# Altium footprint library Amirreza.PcbLib: 524 footprints (part 24 of 33)
Each footprint in its own frame and in the unit in brackets; x right, y up, seen from the top. Pads: shape width x height; smd on the part's side, far side on the other; paste and mask are expansions set on the pad; w line width, h text height; cw(c..) or ccw(c..) is an arc to the next point about the centre after c.
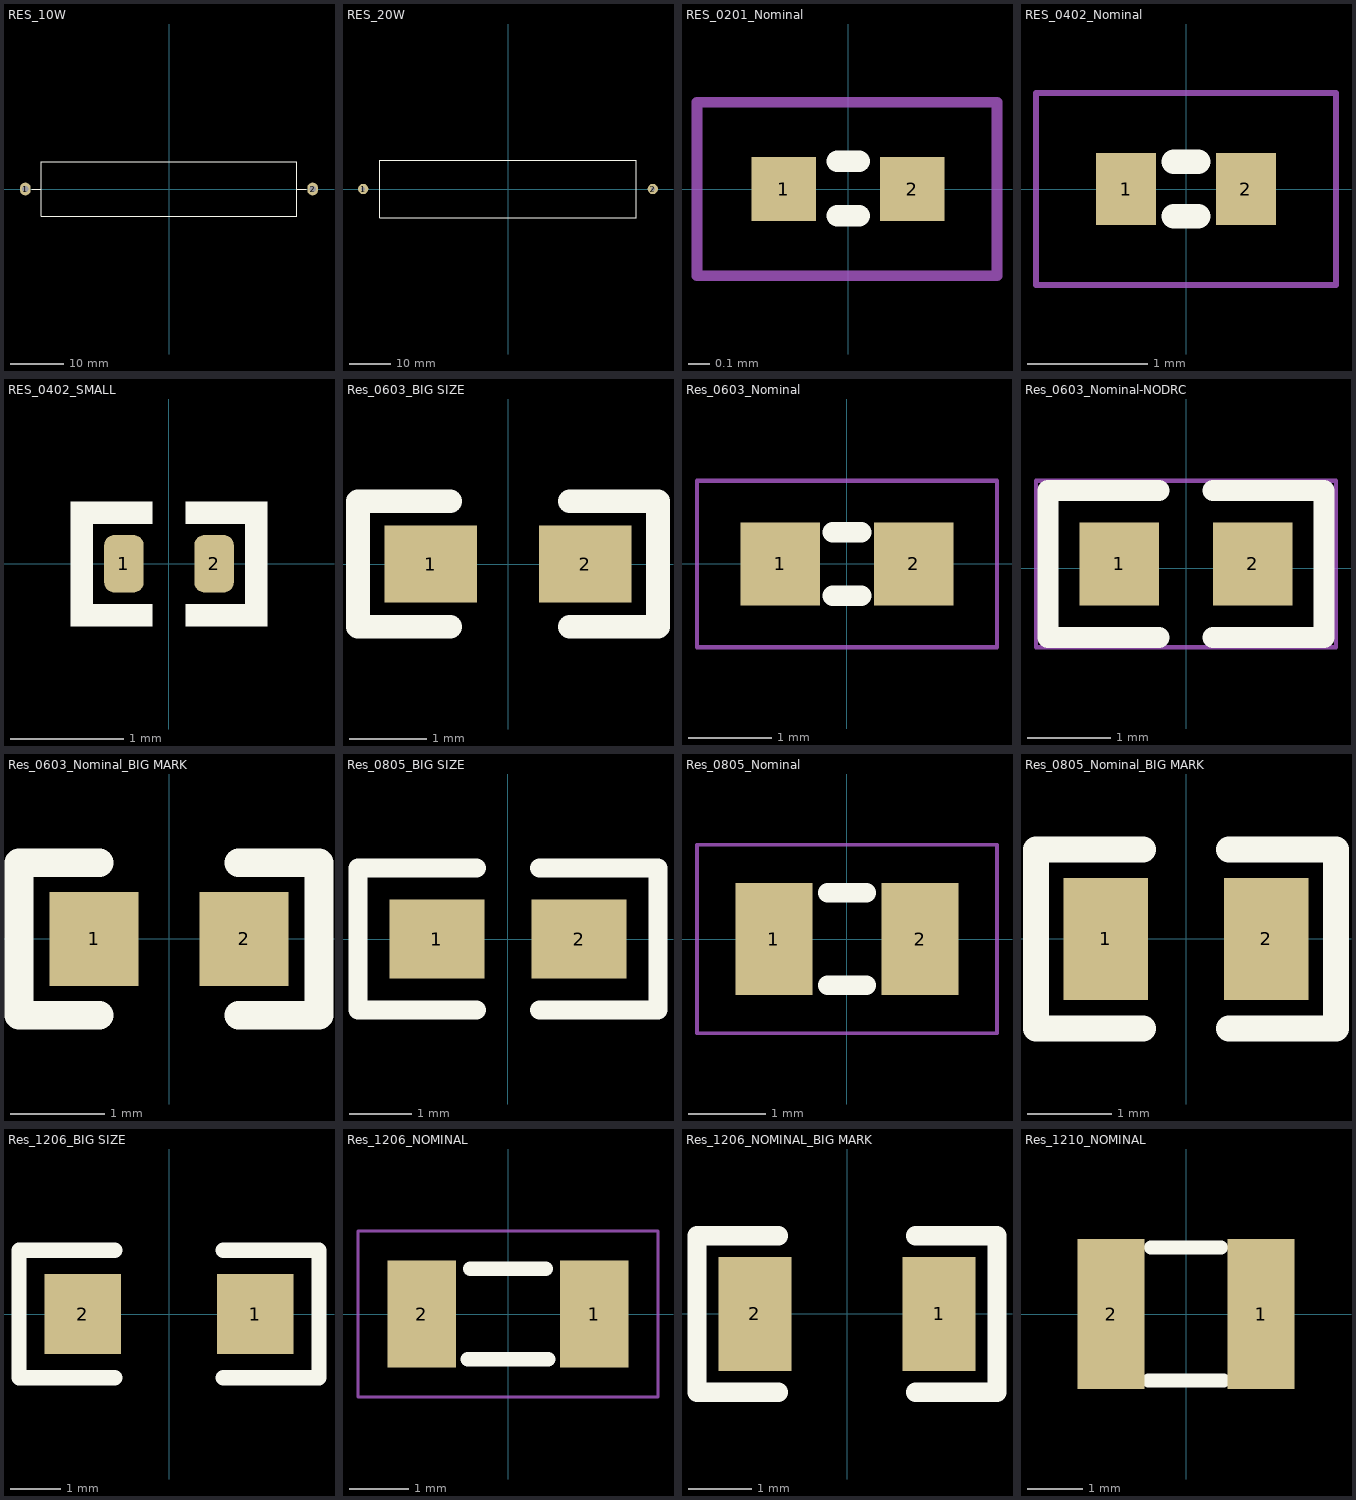
[diagram p23: the footprints below, top view; thin cyan lines are the x and y axes]

## RES_10W [mm] "RESISTOR 10 WATT, Ceramic Wirewound"
height 9
pads (2):
  oval 2x2.4 hole 1.2: 1(-27,0) 2(27,0)
Top Overlay:
  lines w0.2: -25.8,0 -24,0 ; 24,0 25.8,0 ; -24,-5.1 24,-5.1 24,5.1 -24,5.1 -24,-5.1
3D body: height 9, standoff 0, extent -23.9,-5 23.9,5
3D body: height 4.9, standoff 4.1, extent -27.4,-0.4 -23.9,0.4
3D body: height 4.8, standoff -2, extent -27.399,-0.397 -26.601,0.4
3D body: height 4.8, standoff -2, extent 26.601,-0.4 27.399,0.396
3D body: height 4.9, standoff 4.1, extent 23.9,-0.4 27.4,0.4

## RES_20W [mm]
height 25
pads (2):
  round 2.5 hole 1: 1(-35,0) 2(35,0)
Top Overlay:
  lines w0.1: -31,-7 31,-7 31,7 -31,7 -31,-7

## RES_0201_Nominal [mm] "CHIP Resistor, 0.5x0.25mm, 0201, soldered"
pads (2):
  rect 0.3x0.3 smd mask+0.05: 1(-0.3,0) 2(0.3,0)
Top Overlay:
  lines w0.102: -0.051,-0.124 0.051,-0.124 ; -0.051,0.13 0.051,0.13
Mechanical 13:
  lines w0.05: -0.704,-0.404 0.694,-0.404 0.694,0.404 -0.704,0.404 -0.704,-0.404
3D body "r0201_Res.step": height 0.31, standoff 0, extent -0.44,-0.15 0.44,0.15

## RES_0402_Nominal [mm]
pads (2):
  rect 0.5x0.6 smd: 1(-0.5,0) 2(0.5,0)
Top Overlay:
  lines w0.203: -0.102,-0.229 0.102,-0.229 ; -0.102,0.229 0.102,0.229
Mechanical 13:
  lines w0.05: -1.25,-0.8 -1.25,0.8 1.25,0.8 1.25,-0.8 -1.25,-0.8
3D body "User Library-R SMD 0402.STEP": height 0.35, standoff 0, extent -0.532,-0.25 0.468,0.25

## RES_0402_SMALL [mm]
pads (2):
  rrect50% 0.35x0.508 smd mask+0.075: 1(-0.4,0) 2(0.4,0)
Top Overlay:
  region: -0.675,-0.558 -0.675,0.554 -0.875,0.554 -0.875,-0.558
  rectangle: -0.875,0.354 -0.145,0.554
  rectangle: -0.875,-0.558 -0.145,-0.358
  region: 0.875,-0.558 0.875,0.554 0.675,0.554 0.675,-0.558
  region: 0.875,0.554 0.145,0.554 0.145,0.354 0.875,0.354
  region: 0.875,-0.358 0.145,-0.358 0.145,-0.558 0.875,-0.558
3D body "User Library-R SMD 0402.STEP": height 0.35, standoff 0, extent -0.505,-0.25 0.495,0.25

## Res_0603_BIG SIZE [mm]
pads (2):
  rect 1.2x1 smd: 1(-1,0) 2(1,0)
Top Overlay:
  lines w0.305: -1.94,-0.813 -1.94,0.813 ; -1.889,-0.813 -0.746,-0.813 ; -1.889,0.813 -0.746,0.813 ; 0.797,-0.813 1.94,-0.813 1.94,0.813 0.797,0.813
3D body "User Library-R SMD 0603.STEP": height 0.26, standoff -0.19, extent -0.799,-0.372 0.841,0.478

## Res_0603_Nominal [mm]
pads (2):
  rect 0.95x1 smd: 1(-0.8,0) 2(0.8,0)
Top Overlay:
  lines w0.25: -0.171,-0.381 0.171,-0.381 ; -0.171,0.381 0.171,0.381
Mechanical 13:
  lines w0.05: -1.8,-1 -1.8,1 1.8,1 1.8,-1 -1.8,-1
3D body "User Library-R SMD 0603.STEP": height 0.26, standoff -0.19, extent -0.799,-0.423 0.841,0.427

## Res_0603_Nominal-NODRC [mm]
pads (2):
  rect 0.95x1 smd: 1(-0.8,0.051) 2(0.8,0.051)
Top Overlay:
  lines w0.254: -1.656,-0.83 -1.656,0.932 ; -1.647,-0.83 -0.325,-0.83 ; -1.647,0.932 -0.326,0.932 ; 0.325,-0.83 1.647,-0.83 ; 0.325,0.932 1.647,0.932 ; 1.656,-0.83 1.656,0.932
Mechanical 13:
  lines w0.05: -1.8,-0.949 1.8,-0.949 1.8,1.051 -1.8,1.051 -1.8,-0.949
3D body "User Library-R SMD 0603.STEP": height 0.26, standoff -0.19, extent -0.799,-0.372 0.841,0.478

## Res_0603_Nominal_BIG MARK [mm]
pads (2):
  rect 0.95x1 smd: 1(-0.8,0) 2(0.8,0)
Top Overlay:
  lines w0.305: -0.746,-0.813 -1.6,-0.813 -1.6,0.812 -0.746,0.812 ; 0.746,-0.813 1.6,-0.813 1.6,0.812 0.746,0.812
3D body "User Library-R SMD 0603.STEP": height 0.26, standoff -0.19, extent -0.799,-0.423 0.841,0.427

## Res_0805_BIG SIZE [mil]
pads (2):
  rect 60x50 smd: 1(-45,0) 2(45,0)
Top Overlay:
  lines w12: -20,-45 -95,-45 -95,45 -20,45 ; 20,-45 95,-45 95,45 20,45
3D body "User Library-R SMD 0805.STEP": height 18.34, standoff 0.62, extent -39.55,-24.42 39.19,24.79

## Res_0805_Nominal [mm]
pads (2):
  rect 1x1.45 smd: 1(-0.95,0) 2(0.95,0)
Top Overlay:
  lines w0.25: -0.254,-0.6 0.254,-0.6 ; -0.254,0.6 0.254,0.6
Mechanical 13:
  lines w0.05: -1.95,-1.225 -1.95,1.225 1.95,1.225 1.95,-1.225 -1.95,-1.225
3D body "User Library-R SMD 0805.STEP": height 0.47, standoff 0.02, extent -0.999,-0.625 1.001,0.625

## Res_0805_Nominal_BIG MARK [mm]
pads (2):
  rect 1x1.45 smd: 1(-0.95,0) 2(0.95,0)
Top Overlay:
  lines w0.305: -0.507,-1.06 -1.778,-1.06 -1.778,1.06 -0.507,1.06 ; 0.507,-1.06 1.778,-1.06 1.778,1.06 0.507,1.06
3D body "User Library-R SMD 0805.STEP": height 0.47, standoff 0.02, extent -0.999,-0.625 1.001,0.625

## Res_1206_BIG SIZE [mil]
pads (2):
  rect 60x62.99 smd: 1(67.5,0) 2(-67.5,0)
Top Overlay:
  lines w12: -42.5,-50 -117.5,-50 -117.5,50 -42.5,50 ; 42.5,-50 117.5,-50 117.5,50 42.5,50
3D body "User Library-1206.SLDPRT": height 20.67, standoff -0.98, extent -62.35,-31.62 63.63,31.37

## Res_1206_NOMINAL [mm]
pads (2):
  rect 1.15x1.8 smd: 1(1.45,0) 2(-1.45,0)
Top Overlay:
  lines w0.25: -0.673,-0.762 0.673,-0.762 ; -0.635,0.762 0.635,0.762
Mechanical 13:
  lines w0.05: -2.525,-1.4 -2.525,1.4 2.525,1.4 2.525,-1.4 -2.525,-1.4
3D body "User Library-1206.SLDPRT": height 0.53, standoff -0.03, extent -1.6,-0.787 1.6,0.813

## Res_1206_NOMINAL_BIG MARK [mm]
pads (2):
  rect 1.15x1.8 smd: 1(1.45,0) 2(-1.45,0)
Top Overlay:
  lines w0.305: -1.079,-1.231 -2.363,-1.231 -2.363,1.229 -1.079,1.229 ; 1.078,-1.231 2.362,-1.231 2.362,1.229 1.078,1.229
3D body "User Library-1206.SLDPRT": height 0.53, standoff -0.03, extent -1.6,-0.787 1.6,0.813

## Res_1210_NOMINAL [mm]
pads (2):
  rect 1.2x2.7 smd: 1(1.35,0) 2(-1.35,0)
Top Overlay:
  lines w0.25: -0.673,-1.2 0.673,-1.2 ; -0.635,1.2 0.635,1.2
3D body "User Library-R_1210.step": height 0.6, standoff 0, extent -1.6,-1.25 1.6,1.25